# Altium footprint library PcbLib1.PcbLib: 28 footprints (part 2 of 2)
Each footprint in its own frame and in the unit in brackets; x right, y up, seen from the top. Pads: shape width x height; smd on the part's side, far side on the other; paste and mask are expansions set on the pad; w line width, h text height; cw(c..) or ccw(c..) is an arc to the next point about the centre after c.
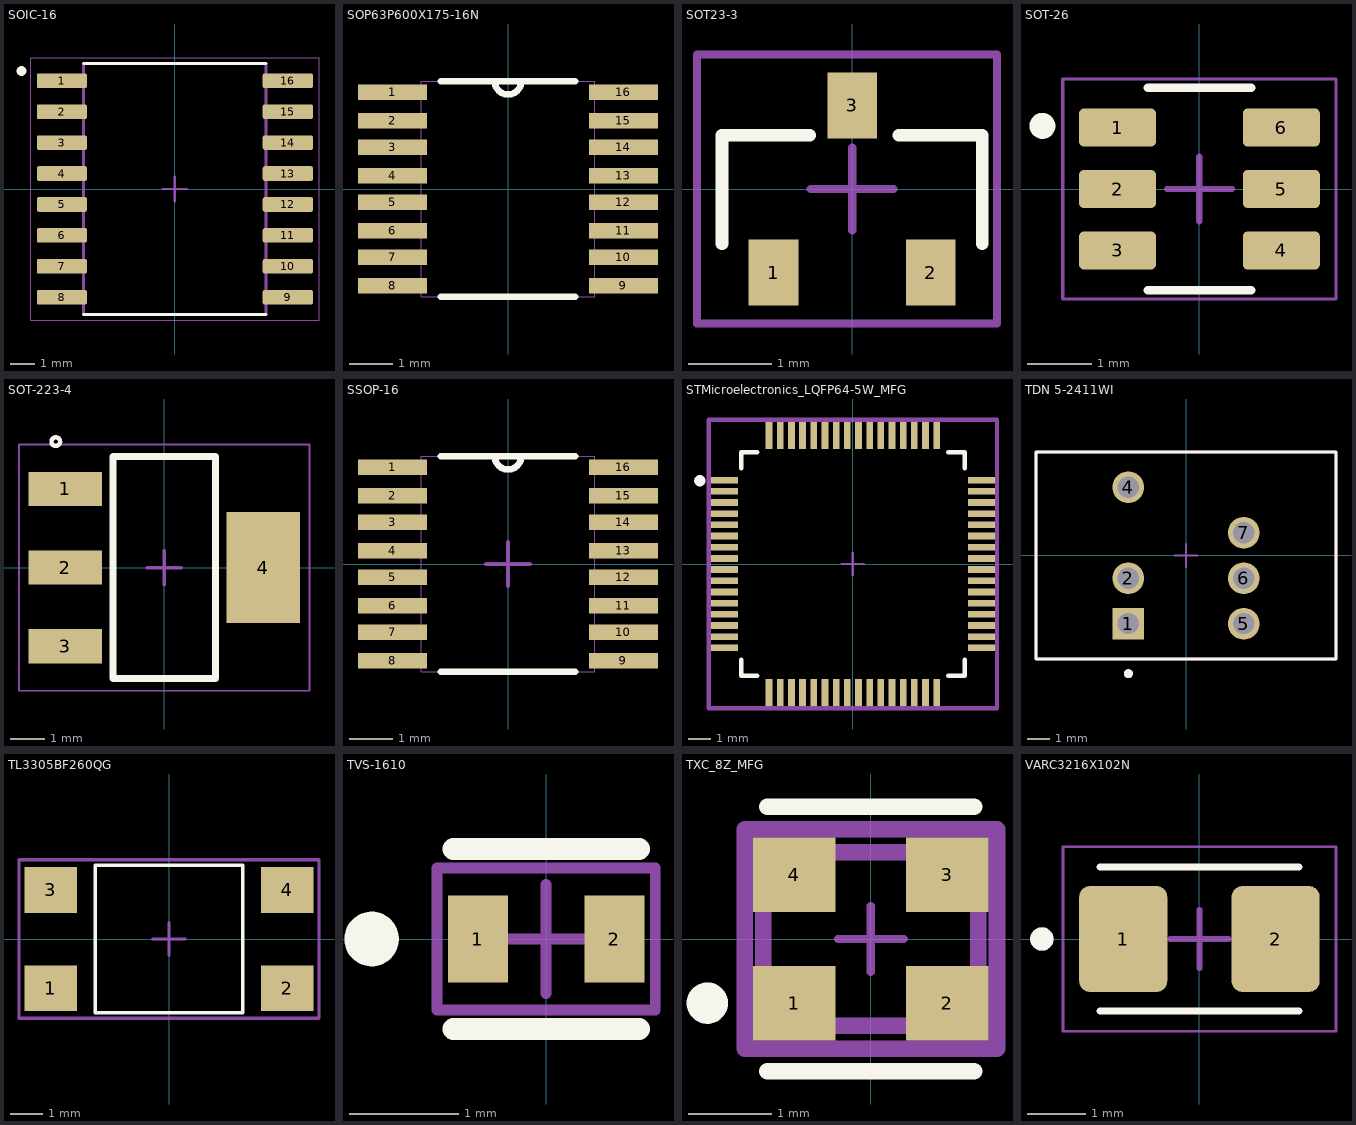
[diagram p1: the footprints below, top view; thin cyan lines are the x and y axes]

## SOIC-16 [mm]
pads (16):
  rrect25% 2.06x0.6 smd: 1(-4.64,4.445) 2(-4.64,3.175) 3(-4.64,1.905) 4(-4.64,0.635) 5(-4.64,-0.635) 6(-4.64,-1.905) 7(-4.64,-3.175) 8(-4.64,-4.445) 9(4.64,-4.445) 10(4.64,-3.175) 11(4.64,-1.905) 12(4.64,-0.635) 13(4.64,0.635) 14(4.64,1.905) 15(4.64,3.175) 16(4.64,4.445)
Top Overlay:
  circle w0.2: c-6.3,4.845 r0.1
  circle w0.2: c-6.3,4.845 r0.1
  lines w0.127: -3.75,-5.15 3.75,-5.15 ; -3.75,5.15 3.75,5.15
Top Component Center:
  lines w0.05: -5.92,-5.4 -5.92,5.4 5.92,5.4 5.92,-5.4 -5.92,-5.4
  lines w0.1: -0.5,0 0.5,0 ; 0,-0.5 0,0.5
Top Designator:
  text ".Designator" at -0.5,0.146 h1
Mechanical 13:
  lines w0.127: -3.75,-5.15 -3.75,5.15 3.75,5.15 3.75,-5.15 -3.75,-5.15
3D body "MAX3232IDWRG4.STEP": height 2.55, standoff -0.1, extent -5.22,-5.093 5.08,5.207

## SOP63P600X175-16N [mil]
pads (16):
  rect 63x14 smd: 1(-105,88) 2(-105,62) 3(-105,38) 4(-105,12) 5(-105,-12) 6(-105,-38) 7(-105,-62) 8(-105,-88) 9(105,-88) 10(105,-62) 11(105,-38) 12(105,-12) 13(105,12) 14(105,38) 15(105,62) 16(105,88)
Top Overlay:
  lines w6: -61,-98 61,-98 ; -61,98 -12,98 ; 61,98 12,98 ; -12,98 ccw(c0,98) 12,98 ; -12,98 12,98
Mechanical 13:
  lines w0: -12,98 ccw(c0,98) 12,98 ; -12,98 12,98 ; -12,98 -79,98 -79,-98 79,-98 79,98 12,98 ; -122,-93 -122,-82 -79,-82 -79,-93 -122,-93 ; -122,-68 -122,-57 -79,-57 -79,-68 -122,-68 ; -122,-43 -122,-32 -79,-32 -79,-43 -122,-43 ; -122,-18 -122,-7 -79,-7 -79,-18 -122,-18 ; -122,7 -122,18 -79,18 -79,7 -122,7 ; -122,32 -122,43 -79,43 -79,32 -122,32 ; -122,57 -122,68 -79,68 -79,57 -122,57 ; -122,82 -122,93 -79,93 -79,82 -122,82 ; 79,-93 79,-82 122,-82 122,-93 79,-93 ; 79,-68 79,-57 122,-57 122,-68 79,-68 ; 79,-43 79,-32 122,-32 122,-43 79,-43 ; 79,-18 79,-7 122,-7 122,-18 79,-18 ; 79,7 79,18 122,18 122,7 79,7 ; 79,32 79,43 122,43 122,32 79,32 ; 79,57 79,68 122,68 122,57 79,57 ; 79,82 79,93 122,93 122,82 79,82
3D body "ADS7841EB.STEP": height 67, standoff -2, extent -118,-96.5 118,96.5

## SOT23-3 [mm]
pads (3):
  rect 0.6x0.8 smd: 1(-0.95,-1.01) 2(0.95,-1.01) 3(0,1.01)
Top Overlay:
  lines w0.152: -1.572,-0.662 -1.572,0.65 -0.514,0.65 ; 0.564,0.65 1.572,0.65 1.572,-0.662
Top Component Center:
  lines w0.1: -0.5,0 0.5,0 ; 0,-0.5 0,0.5 ; -1.875,-1.625 1.75,-1.625 1.75,1.625 -1.875,1.625 -1.875,-1.625
Top Designator:
  lines w0.1: -1.875,-1.625 1.75,-1.625 1.75,1.625 -1.875,1.625 -1.875,-1.625
  text ".Designator" at -0.55,-0.229 h1
Mechanical 13:
  region: 0.229,0.701 -0.229,0.701 -0.229,1.285 0.229,1.285
  region: 1.168,-1.306 0.711,-1.306 0.711,-0.721 1.168,-0.721
  region: -0.711,-1.307 -1.17,-1.307 -1.17,-0.721 -0.711,-0.721
3D body "BC857BLT3G.STEP": height 1.02, standoff -0.09, extent -1.45,-1.335 1.45,1.065

## SOT-26 [mm]
pads (6):
  rrect25% 1.19x0.59 smd: 1(-1.265,0.95) 2(-1.265,0) 3(-1.265,-0.95) 4(1.265,-0.95) 5(1.265,0) 6(1.265,0.95)
Top Overlay:
  circle w0.2: c-2.425,0.975 r0.1
  lines w0.127: -0.8,-1.565 0.8,-1.565 ; -0.8,1.565 0.8,1.565
Top Component Center:
  lines w0.05: -2.11,-1.7 2.11,-1.7 2.11,1.7 -2.11,1.7 -2.11,-1.7
  lines w0.1: -0.5,0 0.5,0 ; 0,-0.5 0,0.5
Top Designator:
  text ".Designator" at -0.5,-0.354 h1
3D body "step_temp.STEP": height 1.45, standoff 0, extent -1.4,-1.45 1.4,1.45

## SOT-223-4 [mm]
pads (4):
  rect 2.15x1 smd: 1(-2.9,2.3) 2(-2.9,0) 3(-2.9,-2.3)
  rect 2.15x3.25 smd: 4(2.9,0)
Top Overlay:
  circle w0.127: c-3.175,3.683 r0.127
  lines w0.203: -1.5,-3.25 1.5,-3.25 1.5,3.25 -1.5,3.25 -1.5,-3.25
Top Component Center:
  lines w0.05: -4.25,-3.6 -4.25,3.6 4.25,3.6 4.25,-3.6 -4.25,-3.6
  lines w0.1: -0.5,0 0.5,0 ; 0,-0.5 0,0.5
Top Designator:
  lines w0.05: -4.25,-3.6 -4.25,3.6 4.25,3.6 4.25,-3.6 -4.25,-3.6
  text ".Designator" at -1,-0.207 h2
3D body "NCP1117ST33T3G.STEP": height 1.7, standoff -0.1, extent -3.498,-3.25 3.5,3.25

## SSOP-16 [mil]
pads (16):
  rect 63x14 smd: 1(-105,88) 2(-105,62) 3(-105,38) 4(-105,12) 5(-105,-12) 6(-105,-38) 7(-105,-62) 8(-105,-88) 9(105,-88) 10(105,-62) 11(105,-38) 12(105,-12) 13(105,12) 14(105,38) 15(105,62) 16(105,88)
Top Overlay:
  lines w6: -61,-98 61,-98 ; -61,98 -12,98 ; 61,98 12,98 ; -12,98 ccw(c0,98) 12,98 ; -12,98 12,98
Top Component Center:
  lines w3.94: -19.68,0 19.68,0 ; 0,-19.68 0,19.68
Top Designator:
  text ".Designator" at -39.37,5.76 h39.37
Mechanical 13:
  lines w0: -12,98 ccw(c0,98) 12,98 ; -12,98 12,98 ; -12,98 -79,98 -79,-98 79,-98 79,98 12,98 ; -122,-93 -122,-82 -79,-82 -79,-93 -122,-93 ; -122,-68 -122,-57 -79,-57 -79,-68 -122,-68 ; -122,-43 -122,-32 -79,-32 -79,-43 -122,-43 ; -122,-18 -122,-7 -79,-7 -79,-18 -122,-18 ; -122,7 -122,18 -79,18 -79,7 -122,7 ; -122,32 -122,43 -79,43 -79,32 -122,32 ; -122,57 -122,68 -79,68 -79,57 -122,57 ; -122,82 -122,93 -79,93 -79,82 -122,82 ; 79,-93 79,-82 122,-82 122,-93 79,-93 ; 79,-68 79,-57 122,-57 122,-68 79,-68 ; 79,-43 79,-32 122,-32 122,-43 79,-43 ; 79,-18 79,-7 122,-7 122,-18 79,-18 ; 79,7 79,18 122,18 122,7 79,7 ; 79,32 79,43 122,43 122,32 79,32 ; 79,57 79,68 122,68 122,57 79,57 ; 79,82 79,93 122,93 122,82 79,82
3D body "ADS7841EB.STEP": height 68, standoff -1, extent -113,-96.5 123,96.5

## STMicroelectronics_LQFP64-5W_MFG [mm]
pads (64):
  rect 1.2x0.3 smd paste+0 mask+0: 1(-5.75,3.75) 2(-5.75,3.25) 3(-5.75,2.75) 4(-5.75,2.25) 5(-5.75,1.75) 6(-5.75,1.25) 7(-5.75,0.75) 8(-5.75,0.25) 9(-5.75,-0.25) 10(-5.75,-0.75) 11(-5.75,-1.25) 12(-5.75,-1.75) 13(-5.75,-2.25) 14(-5.75,-2.75) 15(-5.75,-3.25) 16(-5.75,-3.75) 33(5.75,-3.75) 34(5.75,-3.25) 35(5.75,-2.75) 36(5.75,-2.25) 37(5.75,-1.75) 38(5.75,-1.25) 39(5.75,-0.75) 40(5.75,-0.25) 41(5.75,0.25) 42(5.75,0.75) 43(5.75,1.25) 44(5.75,1.75) 45(5.75,2.25) 46(5.75,2.75) 47(5.75,3.25) 48(5.75,3.75)
  rect 0.3x1.2 smd paste+0 mask+0: 17(-3.75,-5.75) 18(-3.25,-5.75) 19(-2.75,-5.75) 20(-2.25,-5.75) 21(-1.75,-5.75) 22(-1.25,-5.75) 23(-0.75,-5.75) 24(-0.25,-5.75) 25(0.25,-5.75) 26(0.75,-5.75) 27(1.25,-5.75) 28(1.75,-5.75) 29(2.25,-5.75) 30(2.75,-5.75) 31(3.25,-5.75) 32(3.75,-5.75) 49(3.75,5.75) 50(3.25,5.75) 51(2.75,5.75) 52(2.25,5.75) 53(1.75,5.75) 54(1.25,5.75) 55(0.75,5.75) 56(0.25,5.75) 57(-0.25,5.75) 58(-0.75,5.75) 59(-1.25,5.75) 60(-1.75,5.75) 61(-2.25,5.75) 62(-2.75,5.75) 63(-3.25,5.75) 64(-3.75,5.75)
Top Overlay:
  circle w0.25: c-6.85,3.725 r0.125
  lines w0.2: -5,-4.275 -5,-5 -4.275,-5 ; -5,4.275 -5,5 -4.275,5 ; 4.275,-5 5,-5 5,-4.275 ; 4.275,5 5,5 5,4.275
Top Component Center:
  lines w0.1: -0.5,0 0.5,0 ; 0,-0.5 0,0.5
  lines w0.2: -6.45,-6.45 6.45,-6.45 6.45,6.45 -6.45,6.45 -6.45,-6.45
Top Designator:
  lines w0.2: -6.45,-6.45 -6.45,6.45 6.45,6.45 6.45,-6.45 -6.45,-6.45
  text ".Designator" at 0,0.188 h1
3D body "IC_STMicroelectronics_STM32F405RGT6_eec.STEP": height 1.6, standoff 0, extent -5.999,-6.001 6.001,5.999

## TDN 5-2411WI [mm]
pads (6):
  rect 1.4x1.4 hole 0.93: 1(-2.54,-3)
  round 1.4 hole 0.93: 2(-2.54,-1) 4(-2.54,3) 5(2.54,-3) 6(2.54,-1) 7(2.54,1)
Top Overlay:
  circle w0.2: c-2.535,-5.2 r0.1
  lines w0.127: -6.6,-4.55 6.6,-4.55 6.6,4.55 -6.6,4.55 -6.6,-4.55
Top Component Center:
  lines w0.1: -0.5,0 0.5,0 ; 0,-0.5 0,0.5
  lines w0.127: -6.6,-4.55 6.6,-4.55 6.6,4.551 -6.6,4.551 -6.6,-4.55
Top Designator:
  lines w0.127: -6.6,-4.55 -6.6,4.55 6.6,4.55 6.6,-4.55 -6.6,-4.55
  text ".Designator" at -0.696,-0.42 h1.52
3D body "TDN 5-2411WI.STEP": height 10.57, standoff -4.11, extent -6.586,-4.674 6.614,4.426

## TL3305BF260QG [mm]
pads (4):
  rect 1.6x1.4 smd: 1(-3.6,-1.5) 2(3.6,-1.5) 3(-3.6,1.5) 4(3.6,1.5)
Top Overlay:
  lines w0.1: -2.25,-2.25 2.25,-2.25 2.25,2.25 -2.25,2.25 -2.25,-2.25
Top Component Center:
  lines w0.1: -0.5,0 0.5,0 ; 0,-0.5 0,0.5 ; -4.575,-2.417 -4.575,2.421 4.575,2.421 4.575,-2.417 -4.575,-2.417
Top Designator:
  lines w0.1: -4.575,-2.417 -4.575,2.421 4.575,2.421 4.575,-2.417 -4.575,-2.417
  text ".Designator" at -1,-0.207 h2
3D body "TL3305BF260QG--3DModel-STEP-520916.STEP": height 4.9, standoff -0.1, extent -3.75,-2.25 3.75,2.25

## TVS-1610 [mm]
pads (2):
  rect 0.55x0.8 smd paste-1000 mask+0: 1(-0.625,0) 2(0.625,0)
Top Overlay:
  circle w0.25: c-1.6,0 r0.125
  lines w0.2: -0.85,-0.825 0.85,-0.825 ; -0.85,0.825 0.85,0.825
Top Paste:
  rectangle: -0.885,-0.38 -0.365,0.38
  rectangle: 0.365,-0.38 0.885,0.38
Top Component Center:
  lines w0.1: -0.5,0 0.5,0 ; 0,-0.5 0,0.5 ; -1,-0.65 1,-0.65 1,0.65 -1,0.65 -1,-0.65
Top Designator:
  lines w0.1: -1,-0.65 -1,0.65 1,0.65 1,-0.65 -1,-0.65
  text ".Designator" at 0,-0.09 h0.5
3D body "Diode_STMicroelectronics_ESDA7P60-1U1M_eec.STEP": height 0.65, standoff 0, extent -0.8,-0.5 0.8,0.5

## TXC_8Z_MFG [mm]
pads (4):
  rect 1x0.9 smd paste+0 mask+0: 1(-0.925,-0.775) 2(0.925,-0.775) 3(0.925,0.775) 4(-0.925,0.775)
Top Overlay:
  circle w0.25: c-1.975,-0.775 r0.125
  lines w0.2: -1.25,-1.6 1.25,-1.6 ; -1.25,1.6 1.25,1.6
Mechanical 10:
  lines w0.2: -1.525,-1.325 1.525,-1.325 1.525,1.325 -1.525,1.325 -1.525,-1.325
  text ".Designator" at 0,0.188 h1
Mechanical 12:
  lines w0.2: -1.3,-1.05 1.3,-1.05 1.3,1.05 -1.3,1.05 -1.3,-1.05
Mechanical 15:
  lines w0.1: -0.397,0 0.397,0 ; 0,-0.397 0,0.397
  lines w0.2: -1.525,-1.325 1.525,-1.325 1.525,1.325 -1.525,1.325 -1.525,-1.325
3D body "Crys_TXC_8Z-12_000MAAJ-T_eec.STEP": height 0.25, standoff 0, extent -1.525,-1.325 1.525,1.325

## VARC3216X102N [mm]
pads (2):
  rrect25% 1.51x1.82 smd: 1(-1.305,0) 2(1.305,0)
Top Overlay:
  circle w0.2: c-2.7,0 r0.1
  lines w0.127: -1.7,-1.234 1.7,-1.234 ; -1.7,1.234 1.7,1.234
Top Component Center:
  lines w0.05: -2.34,-1.58 2.34,-1.58 2.34,1.58 -2.34,1.58 -2.34,-1.58
  lines w0.1: -0.5,0 0.5,0 ; 0,-0.5 0,0.5
Mechanical 13:
  circle w0.2: c-2.7,0 r0.1
3D body "VC120630D650DP.STEP": height 1.01, standoff -0.01, extent -1.6,-0.8 1.6,0.8